# Altium footprint library CUSTOM PCB.PcbLib: 404 footprints (part 6 of 26)
Each footprint in its own frame and in the unit in brackets; x right, y up, seen from the top. Pads: shape width x height; smd on the part's side, far side on the other; paste and mask are expansions set on the pad; w line width, h text height; cw(c..) or ccw(c..) is an arc to the next point about the centre after c.
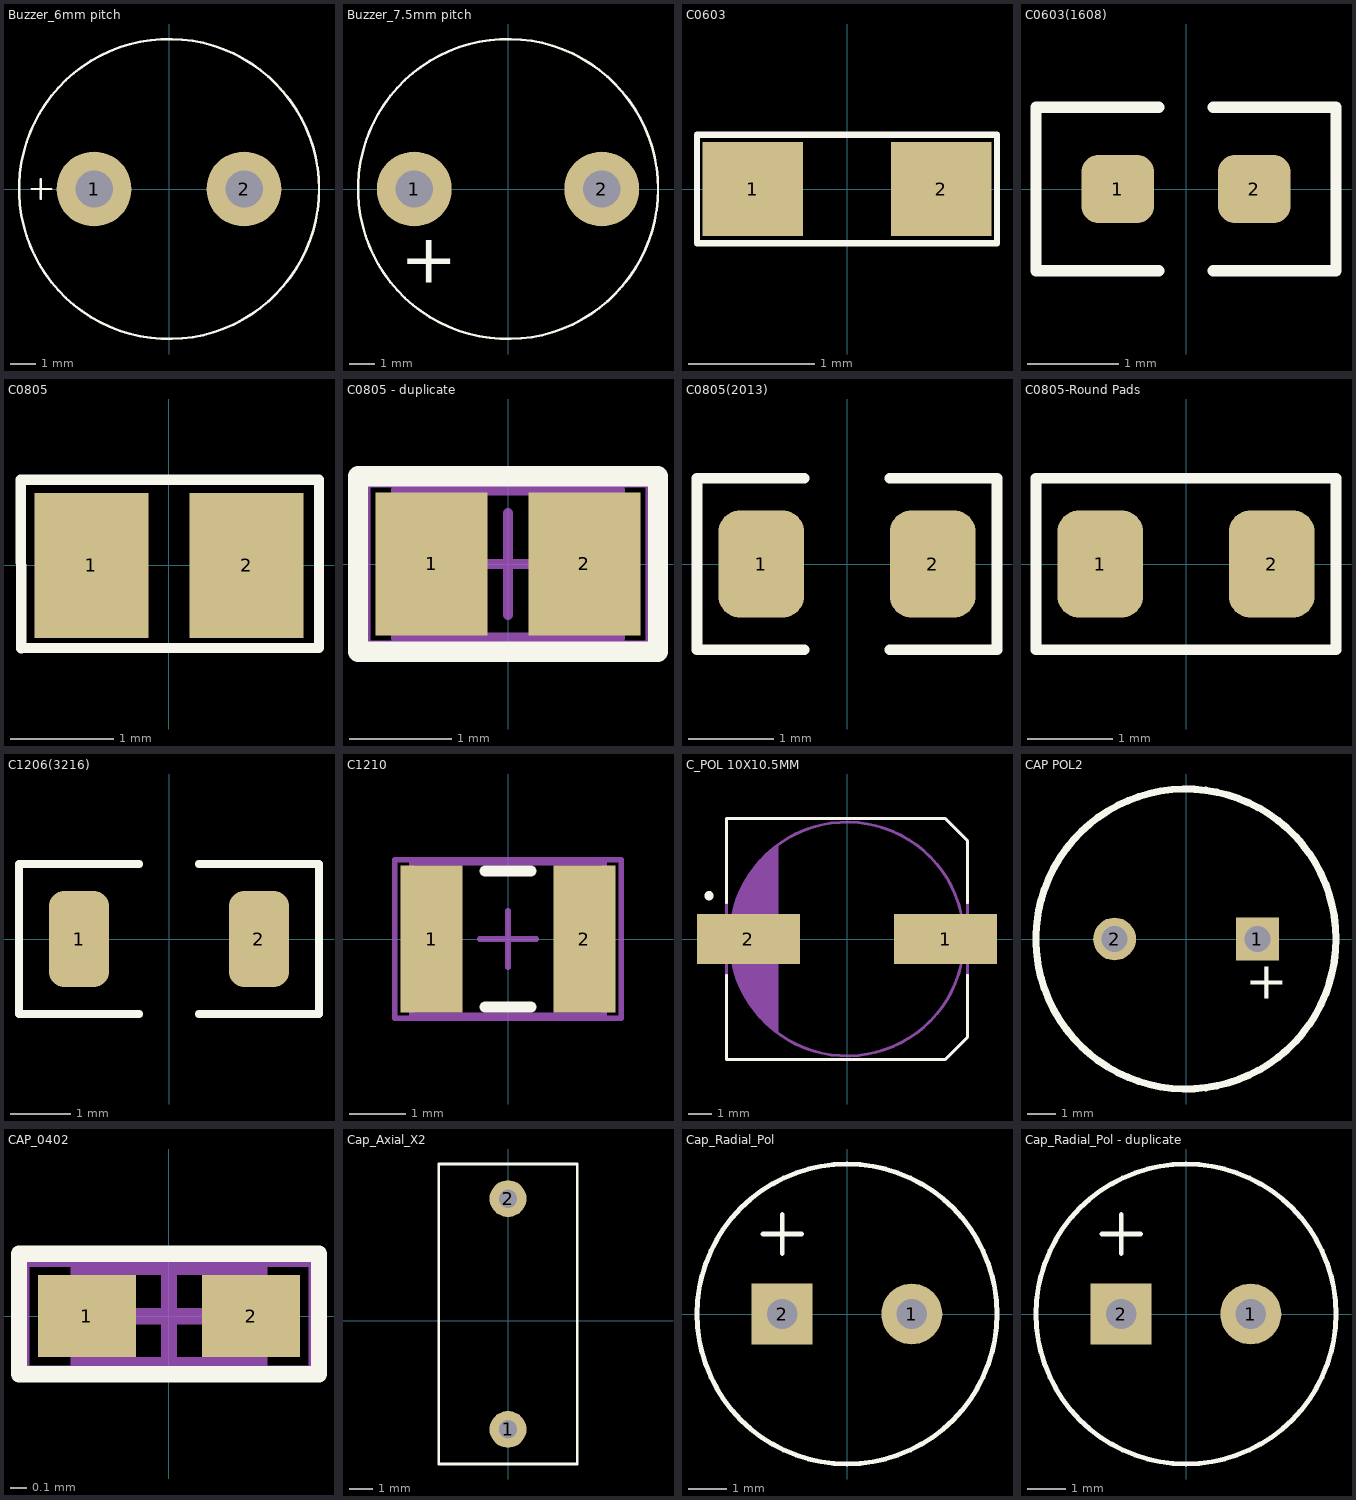
[diagram p5: the footprints below, top view; thin cyan lines are the x and y axes]

## Buzzer_6mm pitch [mm]
pads (2):
  round 3 hole 1.5: 1(-3,0) 2(3,0)
Top Overlay:
  circle w0.1: c0,0 r6
  lines w0.1: -5.5,0 -4.7,0 ; -5.131,-0.381 -5.131,0.381
3D body: height 8.01, standoff 0, extent -1.488,-1.497 1.5,1.497
3D body: height 8, standoff 0, extent -6,-6 6,6
3D body: height 3, standoff 0, extent 2.504,-0.499 3.5,0.499
3D body: height 3, standoff 0, extent -3.496,-0.499 -2.5,0.499

## Buzzer_7.5mm pitch [mm]
pads (2):
  round 3 hole 1.5: 1(-3.75,0) 2(3.75,0)
Top Overlay:
  circle w0.1: c0,0 r6
  text "+" at -4.318,-3.759 h2
3D body: height 8.01, standoff 0, extent -1.488,-1.497 1.5,1.497
3D body: height 8, standoff 0, extent -6,-6 6,6
3D body: height 3, standoff 0, extent 3.252,-0.499 4.248,0.499
3D body: height 3, standoff 0, extent -4.248,-0.499 -3.252,0.499

## C0603 [mm]
pads (2):
  rect 0.8x0.75 smd: 1(-0.75,0) 2(0.75,0)
Top Overlay:
  lines w0.05: -1.194,-0.432 1.194,-0.432 1.194,0.432 -1.194,0.432 -1.194,-0.432
3D body "0603 SMD Capacitor.x_t": height 0.23, standoff -0.07, extent -0.8,-0.4 0.8,0.4

## C0603(1608) [mm] "(1608) Metric"
pads (2):
  rrect50% 0.8x0.75 smd: 1(-0.75,0) 2(0.75,0)
Top Overlay:
  lines w0.125: -0.3,-0.9 -1.65,-0.9 -1.65,0.9 -0.3,0.9 ; 0.3,-0.9 1.65,-0.9 1.65,0.9 0.3,0.9
3D body "C-0603.STEP": height 0.3, standoff 0, extent -0.8,-0.4 0.8,0.4

## C0805 [mm] "Chip Capacitor, Body 2.0x1.3mm, IPC High Density"
height 1.4
pads (2):
  rect 1.1x1.4 smd: 1(-0.75,0) 2(0.75,0)
Top Overlay:
  lines w0.1: -1.434,0.829 1.451,0.829 1.451,-0.798 -1.428,-0.8 -1.434,0.829
3D body: height 1.4, standoff 0, extent -1.1,-0.725 1.1,0.725

## C0805 - duplicate [mm] "pol cap"
pads (2):
  rect 1.1x1.4 smd: 1(-0.75,0) 2(0.75,0)
Top Overlay:
  lines w0.2: -1.473,-0.864 1.473,-0.864 1.473,0.864 -1.473,0.864 -1.473,-0.864
Mechanical 13:
  lines w0.1: -1.1,-0.725 1.1,-0.725 1.1,0.725 -1.1,0.725 -1.1,-0.725
Mechanical 15:
  lines w0.1: -0.5,0 0.5,0 ; 0,-0.5 0,0.5 ; -1.4,-0.8 1.4,-0.8 1.4,0.8 -1.4,0.8 -1.4,-0.8
3D body: height 0.25, standoff 0, extent -0.432,1.6 -0.432,1.6
3D body "CAPC0805.STEP": height 0.82, standoff -0.08, extent -1.3,-0.678 1.301,0.678

## C0805(2013) [mm]
pads (2):
  rrect50% 1x1.25 smd: 1(-1,0) 2(1,0)
Top Overlay:
  lines w0.125: -0.5,-1 -1.75,-1 -1.75,1 -0.5,1 ; 0.5,-1 1.75,-1 1.75,1 0.5,1
3D body "C-0805.STEP": height 0.73, standoff -0.05, extent -1,-0.625 1,0.625

## C0805-Round Pads [mm]
pads (2):
  rrect50% 1x1.25 smd: 1(-1,0) 2(1,0)
Top Overlay:
  lines w0.125: -1.75,-1 1.75,-1 1.75,1 -1.75,1 -1.75,-1
3D body "CAPC0805.STEP": height 0.82, standoff -0.08, extent -1.301,-0.678 1.301,0.678

## C1206(3216) [mm]
pads (2):
  rrect50% 1x1.6 smd: 1(-1.5,0) 2(1.5,0)
Top Overlay:
  lines w0.125: -0.5,-1.25 -2.5,-1.25 -2.5,1.25 -0.5,1.25 ; 0.5,-1.25 2.5,-1.25 2.5,1.25 0.5,1.25
3D body "C-1206.STEP": height 1, standoff 0, extent -1.6,-0.8 1.6,0.8

## C1210 [mm] "Chip Capacitor, Body 3.2x2.5mm, IPC High Density"
height 1.3
pads (2):
  rect 1.1x2.6 smd: 1(-1.35,0) 2(1.35,0)
Top Overlay:
  lines w0.2: -0.4,-1.2 0.4,-1.2 ; -0.4,1.2 0.4,1.2
Mechanical 13:
  lines w0.1: -1.7,-1.35 -1.7,1.35 1.7,1.35 1.7,-1.35 -1.7,-1.35
Mechanical 15:
  lines w0.1: -0.5,0 0.5,0 ; 0,-0.5 0,0.5 ; -2,-1.4 -2,1.4 2,1.4 2,-1.4 -2,-1.4
3D body: height 1.3, standoff 0, extent -1.7,-1.35 1.7,1.35

## C_POL 10X10.5MM [mm]
pads (2):
  rect 4.4x2.12 smd: 1(4.215,0) 2(-4.215,0)
Top Overlay:
  circle w0.2: c-5.9,1.85 r0.1
  lines w0.127: -5.15,-1.55 -5.15,-5.15 4.2,-5.15 5.15,-4.2 5.15,-1.55 ; -5.15,1.55 -5.15,5.15 4.2,5.15 5.15,4.2 5.15,1.55
Mechanical 4:
  circle w0.127: c0,0 r5
  circle w0.127: c0,0 r5
  region: -2.95,4.05 -2.95,-4.05 -3.5,-3.55 -3.9,-3.15 -4.25,-2.65 -4.4,-2.4 -4.85,-1.2 -4.95,-0.45 -5,-0.1 -5,0.45 -4.85,1.2 -4.6,1.95 -4.1,2.9 -3.45,3.65
  region: -2.95,4.05 -2.95,-4.05 -3.5,-3.55 -3.9,-3.15 -4.25,-2.65 -4.4,-2.4 -4.85,-1.2 -4.95,-0.45 -5,-0.1 -5,0.45 -4.85,1.2 -4.6,1.95 -4.1,2.9 -3.45,3.65
  lines w0.127: -5.15,-5.15 4.2,-5.15 ; -5.15,-5.15 -5.15,5.15 ; -5.15,-5.15 4.2,-5.15 ; -5.15,-5.15 -5.15,5.15 ; -5.15,5.15 4.2,5.15 ; -5.15,5.15 4.2,5.15 ; 4.2,-5.15 5.15,-4.2 ; 4.2,-5.15 5.15,-4.2 ; 4.2,5.15 5.15,4.2 ; 4.2,5.15 5.15,4.2 ; 5.15,-4.2 5.15,4.2 ; 5.15,-4.2 5.15,4.2
3D body "Aluminium Electrolytic Capacitor 470µF 25V -10x10_5.step": height 10.8, standoff 0, extent -5.58,-5.088 5.72,5.212

## CAP POL2 [mm] "Capacitor (Radial); 2 Leads"
pads (2):
  rect 1.5x1.5 hole 0.9: 1(2.5,0)
  round 1.5 hole 0.9: 2(-2.5,0)
Top Overlay:
  circle w0.25: c0,0 r5.25
  text "+" at 2.078,-2.088 h1.3
Mechanical 1:
  circle w0.02: c0,0 r5.25
3D body: height 18, standoff 0, extent -5.272,-5.224 5.228,5.27
3D body: height 18.04, standoff 0, extent -5.281,-0.911 -3.482,1.181

## CAP_0402 [mm] "Chip Capacitor, Body 1.0x0.5mm, IPC High Density"
height 1.3
pads (2):
  rect 0.6x0.5 smd: 1(-0.5,0) 2(0.5,0)
Top Overlay:
  lines w0.1: -0.914,-0.356 0.914,-0.356 0.914,0.381 -0.914,0.381 -0.914,-0.356
Mechanical 13:
  lines w0.1: -0.55,-0.3 -0.55,0.3 0.55,0.3 0.55,-0.3 -0.55,-0.3
Mechanical 15:
  lines w0.1: -0.3,0 0.3,0 ; 0,-0.3 0,0.3 ; -0.9,-0.35 -0.9,0.35 0.9,0.35 0.9,-0.35 -0.9,-0.35
3D body: height 1.3, standoff 0, extent -0.55,-0.3 0.55,0.3

## Cap_Axial_X2 [mil] "Cap_Axial_X2_13x12x6_0.8mmDri"
pads (2):
  round 63 hole 31.5: 1(0,-185.04) 2(0,208.66)
Top Overlay:
  lines w5: -118.11,-244.09 -118.11,267.72 118.11,267.72 118.11,-244.09 -118.11,-244.09 ; -118.11,248.03 -118.11,248.03
3D body: height 600, standoff 10, extent -120,-248.19 120,271.81

## Cap_Radial_Pol [mm]
pads (2):
  round 1.6 hole 0.8: 1(1.7,0)
  rect 1.6x1.6 hole 0.8: 2(-1.7,0)
Top Overlay:
  circle w0.127: c0,0 r3.937
  lines w0.127: -2.208,2.1 -1.192,2.1 ; -1.7,1.592 -1.7,2.608
3D body "ELCO-D8P3.5H11.5LD0.6.stp": height 11.75, standoff -2.75, extent -4,-4 4,4

## Cap_Radial_Pol - duplicate [mm]
pads (2):
  round 1.6 hole 0.8: 1(1.7,0)
  rect 1.6x1.6 hole 0.8: 2(-1.7,0)
Top Overlay:
  circle w0.127: c0,0 r3.937
  lines w0.127: -2.208,2.1 -1.192,2.1 ; -1.7,1.592 -1.7,2.608
3D body "ELCO-D8P3.5H11.5LD0.6.stp": height 11.75, standoff -2.75, extent -4,-4 4,4